# Altium footprint library ICs And Semiconductors THD.PcbLib: 507 footprints (part 29 of 32)
Each footprint in its own frame and in the unit in brackets; x right, y up, seen from the top. Pads: shape width x height; smd on the part's side, far side on the other; paste and mask are expansions set on the pad; w line width, h text height; cw(c..) or ccw(c..) is an arc to the next point about the centre after c.
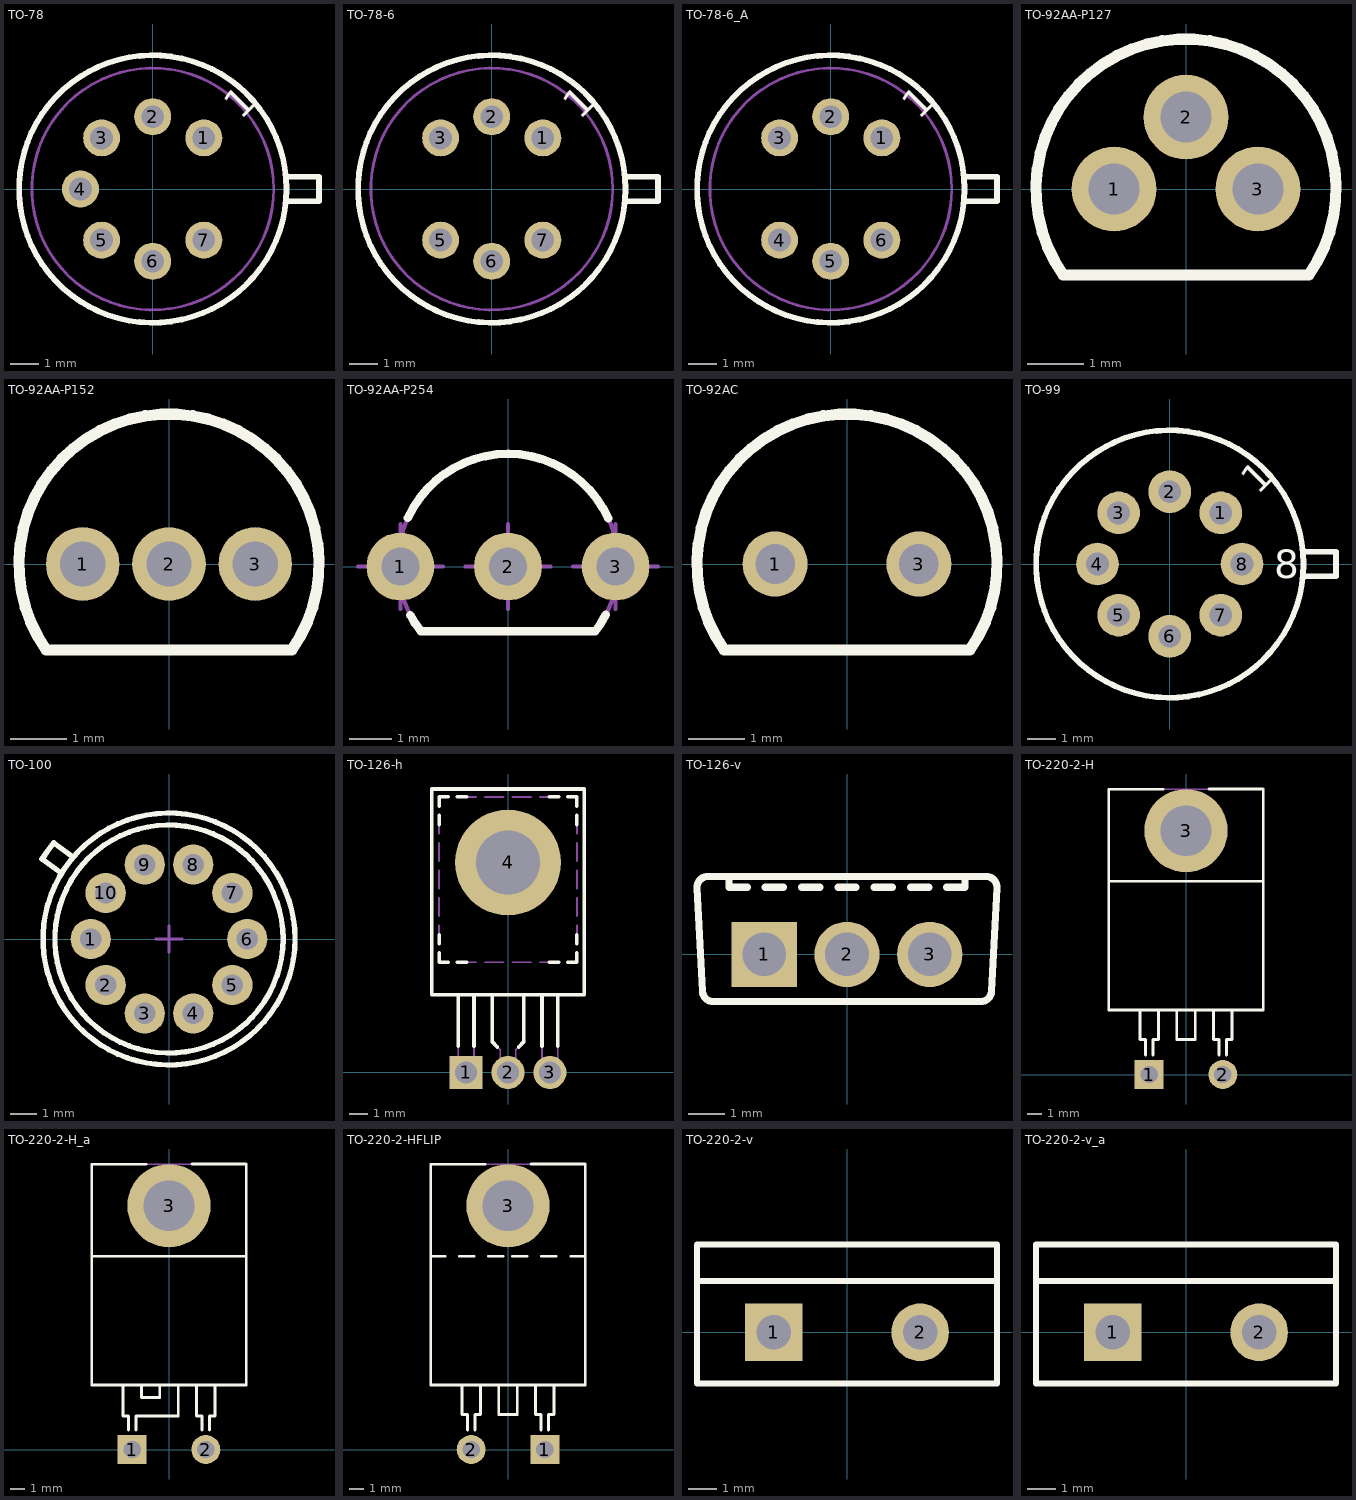
[diagram p28: the footprints below, top view; thin cyan lines are the x and y axes]

## TO-78 [mm] "TO-78 7 Leads, Body Dia. 9.4mm (max), Lead Diameter 5.08mm"
height 4.7
pads (7):
  round 1.3 hole 0.8: 1(1.796,1.796) 2(0,2.54) 3(-1.796,1.796) 4(-2.54,0) 5(-1.796,-1.796) 6(0,-2.54) 7(1.796,-1.796)
Top Overlay:
  circle w0.2: c0,0 r4.699
  lines w0.2: 4.679,-0.432 5.842,-0.432 5.842,0.432 4.679,0.432
  text "1" at 3.098,2.391 h1
Notvisible:
  text "7" at 2.239,-2.946 h1
  text "6" at -0.5,-3.69 h1
  text "5" at -2.946,-2.239 h1
  text "4" at -3.643,0.5 h1
  text "3" at -2.239,2.946 h1
  text "2" at 0.5,3.667 h1
Mechanical 14:
  circle w0.1: c0,0 r4.699
  circle w0.1: c0,0 r4.25
  lines w0.1: 4.679,-0.432 5.842,-0.432 5.842,0.432 4.679,0.432
  text "1" at 3.098,2.391 h1
3D body "TO-78.stp": height 4.7, standoff -3.6, extent -4.695,-4.695 5.835,4.695

## TO-78-6 [mm] "TO-78 6 Leads(1, 2, 3, 5, 6, 7) , Body Dia. 9.4mm (max), Lead Diameter 5.08mm"
height 4.7
pads (6):
  round 1.3 hole 0.8: 1(1.796,1.796) 2(0,2.54) 3(-1.796,1.796) 5(-1.796,-1.796) 6(0,-2.54) 7(1.796,-1.796)
Top Overlay:
  circle w0.2: c0,0 r4.699
  lines w0.2: 4.679,-0.432 5.842,-0.432 5.842,0.432 4.679,0.432
  text "1" at 3.098,2.391 h1
Notvisible:
  text "7" at 2.239,-2.946 h1
  text "6" at -0.5,-3.69 h1
  text "5" at -2.946,-2.239 h1
  text "4" at -3.643,0.5 h1
  text "3" at -2.239,2.946 h1
  text "2" at 0.5,3.667 h1
Mechanical 14:
  circle w0.1: c0,0 r4.699
  circle w0.1: c0,0 r4.25
  lines w0.1: 4.679,-0.432 5.842,-0.432 5.842,0.432 4.679,0.432
  text "1" at 3.098,2.391 h1
3D body "TO-78-6.stp": height 4.7, standoff -3.6, extent -4.695,-4.695 5.835,4.695

## TO-78-6_A [mm] "TO-78 6 Leads, Body Dia. 9.4mm (max), Lead Diameter 5.08mm"
height 4.7
pads (6):
  round 1.3 hole 0.8: 1(1.796,1.796) 2(0,2.54) 3(-1.796,1.796) 4(-1.796,-1.796) 5(0,-2.54) 6(1.796,-1.796)
Top Overlay:
  circle w0.2: c0,0 r4.699
  lines w0.2: 4.679,-0.432 5.842,-0.432 5.842,0.432 4.679,0.432
  text "1" at 3.098,2.391 h1
Notvisible:
  text "6" at 2.239,-2.946 h1
  text "5" at -0.5,-3.69 h1
  text "4" at -2.946,-2.239 h1
  text "3" at -2.239,2.946 h1
  text "2" at 0.5,3.667 h1
Mechanical 14:
  circle w0.1: c0,0 r4.699
  circle w0.1: c0,0 r4.25
  lines w0.1: 4.679,-0.432 5.842,-0.432 5.842,0.432 4.679,0.432
  text "1" at 3.098,2.391 h1
3D body "TO-78-6.stp": height 4.7, standoff -3.6, extent -4.695,-4.695 5.835,4.695

## TO-92AA-P127 [mm] "TO-92 (TO-226),  Pitch 1.27mm, Flat Index, 3 In-Line, Axial Leads, Body Dia. 5.3mm, Leads Dia. 0.5mm (max)"
height 5.33
pads (3):
  round 1.5 hole 0.9: 1(-1.27,0) 2(0,1.27) 3(1.27,0)
Top Overlay:
  lines w0.2: -2.171,-1.52 cw(c0,0) 2.171,-1.52 -2.171,-1.52
Mechanical 14:
  lines w0.1: -2.171,-1.52 cw(c0,0) 2.171,-1.52 -2.171,-1.52
3D body "TO-92AA-P127.stp": height 9.33, standoff -3.2, extent -2.579,-1.53 2.579,2.638

## TO-92AA-P152 [mm] "TO-92 (TO-226),  Pitch 1.524mm, Flat Index, 3 In-Line, Axial Leads, Body Dia. 5.3mm, Leads Dia. 0.5mm (max)"
height 5.33
pads (3):
  round 1.3 hole 0.8: 1(-1.524,0) 2(0,0) 3(1.524,0)
Top Overlay:
  lines w0.2: -2.171,-1.52 cw(c0,0) 2.171,-1.52 -2.171,-1.52
Mechanical 14:
  lines w0.1: -2.171,-1.52 cw(c0,0) 2.171,-1.52 -2.171,-1.52
3D body "TO-92AA-P152.stp": height 9.33, standoff -3.2, extent -2.587,-1.53 2.588,2.66

## TO-92AA-P254 [mm] "TO-92 (TO226), Pitch 2.54mm, Flat Index, 3 In-Line, Bent Leads, Body Dia. 5.3mm"
height 9.33
pads (3):
  round 1.6 hole 0.9: 1(-2.54,0) 2(0,0) 3(2.54,0)
Top Overlay:
  lines w0.2: -2.363,1.145 cw(c0,0.059) 2.369,1.133 ; -2.302,-1.151 ccw(c0,0.059) -2.059,-1.53 2.059,-1.53 ccw(c0,0.059) 2.307,-1.141
Notvisible:
  lines w0.1: -3.54,0 -2.54,0 ; -2.54,-1 -2.54,0 ; -2.54,1 -2.54,0 ; -1.54,0 -2.54,0 ; -1,0 0,0 ; 0,-1 0,0 ; 0,1 0,0 ; 1,0 0,0 ; 1.54,0 2.54,0 ; 2.54,-1 2.54,0 ; 2.54,1 2.54,0 ; 3.54,0 2.54,0
Mechanical 14:
  lines w0.1: -2.059,-1.53 cw(c0,0.059) 2.059,-1.53 -2.059,-1.53
3D body "TO-92AA-P254.stp": height 9.33, standoff -3.2, extent -2.81,-1.53 2.81,2.638

## TO-92AC [mm] "TO-92 (TO-226), Flat Index, 2 In-Line, Pitch 2.54mm, Axial Leads, Body Dia. 5.3mm, Leads Dia. 0.5mm (max)"
height 5.33
pads (2):
  round 1.15 hole 0.7: 1(-1.27,0) 3(1.27,0)
Top Overlay:
  lines w0.2: -2.171,-1.52 cw(c0,0) 2.171,-1.52 -2.171,-1.52
Mechanical 14:
  lines w0.1: -2.171,-1.52 cw(c0,0) 2.171,-1.52 -2.171,-1.52
3D body "TO-92AC.stp": height 9.33, standoff -3.2, extent -2.659,-1.523 2.516,2.667

## TO-99 [mm] "TO-99, 8 Leads, Body Dia. 9.4mm (max)"
height 5.72
pads (8):
  round 1.5 hole 0.8: 1(1.796,1.796) 2(0,2.54) 3(-1.796,1.796) 4(-2.54,0) 5(-1.796,-1.796) 6(0,-2.54) 7(1.796,-1.796) 8(2.54,0)
Top Overlay:
  circle w0.2: c0,0 r4.699
  lines w0.2: 4.679,-0.432 5.842,-0.432 5.842,0.432 4.679,0.432
  text "1" at 3.098,2.391 h1
  text "8" at 3.667,-0.5 h1
Notvisible:
  text "7" at 2.239,-2.946 h1
  text "6" at -0.5,-3.69 h1
  text "5" at -2.946,-2.239 h1
  text "4" at -3.643,0.5 h1
  text "3" at -2.239,2.946 h1
  text "2" at 0.5,3.667 h1
Mechanical 14:
  circle w0.1: c0,0 r4.699
  lines w0.1: 4.679,-0.432 5.842,-0.432 5.842,0.432 4.679,0.432
3D body "TO-99.stp": height 5.72, standoff -3.78, extent -4.7,-4.7 5.842,4.7

## TO-100 [mm] "TO-100, 10 Leads, Body Dia. 9.4mm (max)"
height 6.99
pads (10):
  round 1.5 hole 0.8: 1(-2.92,0) 2(-2.362,-1.716) 3(-0.902,-2.777) 4(0.902,-2.777) 5(2.362,-1.716) 6(2.92,0) 7(2.362,1.716) 8(0.902,2.777) 9(-0.902,2.777) 10(-2.362,1.716)
Top Overlay:
  circle w0.2: c0,0 r4.255
  circle w0.2: c0,0 r4.7
  lines w0.2: -4.747,2.985 -4.011,2.45 ; -4.737,2.978 cw(c0,0) -4.296,3.585 ; -4.306,3.592 -3.57,3.057
Notvisible:
  lines w0.1: -3.42,0 -2.92,0 ; -2.92,-0.5 -2.92,0 ; -2.92,0.5 -2.92,0 ; -2.767,-2.01 -2.362,-1.716 ; -2.767,2.01 -2.362,1.716 ; -2.656,-1.312 -2.362,-1.716 ; -2.656,1.312 -2.362,1.716 ; -2.42,0 -2.92,0 ; -2.068,-2.121 -2.362,-1.716 ; -2.068,2.121 -2.362,1.716 ; -1.958,-1.422 -2.362,-1.716 ; -1.958,1.422 -2.362,1.716 ; -1.378,-2.623 -0.902,-2.777 ; -1.378,2.623 -0.902,2.777 ; -1.057,-3.253 -0.902,-2.777 ; -1.057,3.253 -0.902,2.777 ; -0.748,-2.302 -0.902,-2.777 ; -0.748,2.302 -0.902,2.777 ; -0.5,0 0,0 ; -0.427,-2.932 -0.902,-2.777 ; -0.427,2.932 -0.902,2.777 ; 0,-0.5 0,0 ; 0,0.5 0,0 ; 0.427,-2.932 0.902,-2.777 ; 0.427,2.932 0.902,2.777 ; 0.5,0 0,0 ; 0.748,-2.302 0.902,-2.777 ; 0.748,2.302 0.902,2.777 ; 1.057,-3.253 0.902,-2.777 ; 1.057,3.253 0.902,2.777 ; 1.378,-2.623 0.902,-2.777 ; 1.378,2.623 0.902,2.777 ; 1.958,-1.422 2.362,-1.716 ; 1.958,1.422 2.362,1.716 ; 2.068,-2.121 2.362,-1.716 ; 2.068,2.121 2.362,1.716 ; 2.42,0 2.92,0 ; 2.656,-1.312 2.362,-1.716 ; 2.656,1.312 2.362,1.716 ; 2.767,-2.01 2.362,-1.716 ; 2.767,2.01 2.362,1.716 ; 2.92,-0.5 2.92,0 ; 2.92,0.5 2.92,0 ; 3.42,0 2.92,0
Mechanical 14:
  circle w0.1: c0,0 r4.255
  circle w0.1: c0,0 r4.7
  lines w0.1: -4.747,2.985 -4.011,2.45 cw(c0,0) -3.57,3.057 -4.306,3.592 ; -4.737,2.978 cw(c0,0) -4.296,3.585
3D body "TO-100.stp": height 5.97, standoff -3.6, extent -4.737,-4.7 4.7,4.7

## TO-126-h [mm] "TO-126 3-Terminal - Horizontal Mount"
height 3.45
pads (4):
  rect 1.8x1.8 hole 1.2: 1(-2.28,0)
  round 1.8 hole 1.2: 2(0,0) 3(2.28,0)
  round 5.75 hole 3.5: 4(0,11.43)
Top Overlay:
  lines w0.2: -3.75,6.5 -3.75,6 -3.25,6 ; -3.75,7 -3.75,7.5 ; -3.75,13.5 -3.75,14 ; -3.75,14.5 -3.75,15 -3.25,15 ; -2.75,6 -2.25,6 ; -2.75,15 -2.25,15 ; -2.705,1.439 -2.705,4.23 ; -1.855,1.439 -1.855,4.23 ; -0.85,4.23 -0.85,1.655 -0.579,1.384 ; 0.579,1.384 0.85,1.655 0.85,4.23 ; 1.855,1.439 1.855,4.23 ; 2.25,6 2.75,6 ; 2.25,15 2.75,15 ; 2.705,1.439 2.705,4.23 ; 3.25,6 3.75,6 3.75,6.5 ; 3.25,15 3.75,15 3.75,14.5 ; 3.75,7 3.75,7.5 ; 3.75,13.5 3.75,14 ; -4.15,4.23 4.15,4.23 4.15,15.43 -4.15,15.43 -4.15,4.23
Mechanical 14:
  circle w0.1: c0,11.43 r1.75
  lines w0.1: -3.75,6.5 -3.75,6 -3.25,6 ; -3.75,7 -3.75,8 ; -3.75,8.5 -3.75,9.5 ; -3.75,10 -3.75,11 ; -3.75,11.5 -3.75,12.5 ; -3.75,13 -3.75,14 ; -3.75,14.5 -3.75,15 -3.25,15 ; -2.75,6 -1.75,6 ; -2.75,15 -1.75,15 ; -2.705,4.23 -2.705,0 -1.855,0 -1.855,4.23 ; -1.25,6 -0.25,6 ; -1.25,15 -0.25,15 ; -0.85,4.23 -0.85,1.655 -0.425,1.23 -0.425,0 0.425,0 0.425,1.23 0.85,1.655 0.85,4.23 ; 0.25,6 1.25,6 ; 0.25,15 1.25,15 ; 1.75,6 2.75,6 ; 1.75,15 2.75,15 ; 1.855,4.23 1.855,0 2.705,0 2.705,4.23 ; 3.25,6 3.75,6 3.75,6.5 ; 3.25,15 3.75,15 3.75,14.5 ; 3.75,7 3.75,8 ; 3.75,8.5 3.75,9.5 ; 3.75,10 3.75,11 ; 3.75,11.5 3.75,12.5 ; 3.75,13 3.75,14 ; -4.15,4.23 -4.15,15.43 4.15,15.43 4.15,4.23 -4.15,4.23
3D body "TO-126-H.stp": height 3.45, standoff -3.1, extent -4.134,-0.3 4.134,15.43

## TO-126-v [mm] "TO-126 3-Terminal - Vertical Mount"
height 14.2
pads (3):
  rect 1.8x1.8 hole 1.2: 1(-2.28,0)
  round 1.8 hole 1.2: 2(0,0) 3(2.28,0)
Top Overlay:
  lines w0.2: -3.25,2.15 -3.25,1.85 -2.75,1.85 ; -2.25,1.85 -1.75,1.85 ; -1.25,1.85 -0.75,1.85 ; -0.25,1.85 0.25,1.85 ; 0.75,1.85 1.25,1.85 ; 1.75,1.85 2.25,1.85 ; 2.75,1.85 3.25,1.85 3.25,2.15 ; -4.133,1.834 cw(c-3.834,1.85) -3.834,2.15 3.834,2.15 cw(c3.834,1.85) 4.133,1.834 3.984,-1.016 cw(c3.685,-1) 3.685,-1.3 -3.685,-1.3 cw(c-3.685,-1) -3.984,-1.016 -4.133,1.834
Mechanical 14:
  lines w0.1: -3.25,2.15 -3.25,1.85 -2.75,1.85 ; -2.25,1.85 -1.75,1.85 ; -1.25,1.85 -0.75,1.85 ; -0.25,1.85 0.25,1.85 ; 0.75,1.85 1.25,1.85 ; 1.75,1.85 2.25,1.85 ; 2.75,1.85 3.25,1.85 3.25,2.15 ; -4.133,1.834 cw(c-3.834,1.85) -3.834,2.15 3.834,2.15 cw(c3.834,1.85) 4.133,1.834 3.984,-1.016 cw(c3.685,-1) 3.685,-1.3 -3.685,-1.3 cw(c-3.685,-1) -3.984,-1.016 -4.133,1.834
3D body "TO-126-V.stp": height 14.2, standoff -3.1, extent -4.134,-1.3 4.134,2.15

## TO-220-2-H [mm] "TO-220 2-Terminal + Tab - Horizontal Mount"
height 4.7
pads (3):
  rect 2x2 hole 1.2: 1(-2.54,0)
  round 2 hole 1.2: 2(2.54,0)
  round 5.75 hole 3.5: 3(0,16.828)
Top Overlay:
  lines w0.2: -5.334,13.335 5.334,13.335 ; -3.175,4.445 -3.175,2.413 -2.794,2.413 -2.794,1.35 ; -2.286,1.35 -2.286,2.413 -1.905,2.413 -1.905,4.445 ; -1.6,19.685 -5.334,19.685 -5.334,4.445 5.334,4.445 5.334,19.685 5.319,19.7 1.6,19.7 ; -0.635,4.445 -0.635,2.413 0.635,2.413 0.635,4.445 ; 1.905,4.445 1.905,2.413 2.286,2.413 2.286,1.35 ; 2.794,1.35 2.794,2.413 3.175,2.413 3.175,4.445
Mechanical 14:
  circle w0.1: c0,16.828 r2
  lines w0.1: -5.334,13.335 5.334,13.335 ; -3.175,4.445 -3.175,2.413 -2.794,2.413 -2.794,1.27 ; -2.286,1.27 -2.286,2.413 -1.905,2.413 -1.905,4.445 ; -0.635,4.445 -0.635,2.413 0.635,2.413 0.635,4.445 ; 1.905,4.445 1.905,2.413 2.286,2.413 2.286,1.27 ; 2.794,1.27 2.794,2.413 3.175,2.413 3.175,4.445 ; -5.334,4.445 5.334,4.445 5.334,19.685 -5.334,19.685 -5.334,4.445
3D body "TO-220-2-H.stp": height 4.7, standoff -3.5, extent -5.27,-0.28 5.27,19.49

## TO-220-2-H_a [mm] "TO-220 2-Terminal + Tab - Horizontal Mount"
height 4.7
pads (3):
  rect 2x2 hole 1.2: 1(-2.54,0)
  round 2 hole 1.2: 2(2.54,0)
  round 5.75 hole 3.5: 3(0,16.828)
Top Overlay:
  lines w0.2: -5.334,13.335 5.334,13.335 ; -3.175,4.445 -3.175,2.315 -2.794,2.315 -2.794,1.35 ; -2.286,1.35 -2.286,2.315 0.635,2.315 0.635,4.445 ; -1.905,4.445 -1.905,3.585 -0.635,3.585 -0.635,4.445 ; -1.6,19.685 -5.334,19.685 -5.334,4.445 5.334,4.445 5.334,19.685 5.319,19.7 1.6,19.7 ; 1.905,4.445 1.905,2.315 2.286,2.315 2.286,1.35 ; 2.794,1.35 2.794,2.315 3.175,2.315 3.175,4.445
Mechanical 14:
  circle w0.1: c0,16.828 r2
  lines w0.1: -5.334,13.335 5.334,13.335 ; -3.175,4.445 -3.175,2.315 -2.794,2.315 -2.794,1.35 ; -2.286,1.35 -2.286,2.315 0.635,2.315 0.635,4.445 ; -1.905,4.445 -1.905,3.585 -0.635,3.585 -0.635,4.445 ; 1.905,4.445 1.905,2.315 2.286,2.315 2.286,1.35 ; 2.794,1.35 2.794,2.315 3.175,2.315 3.175,4.445 ; -5.334,4.445 -5.334,19.685 5.334,19.685 5.334,4.445 -5.334,4.445
3D body "TO-220-2-H_a.stp": height 4.7, standoff -3.5, extent -5.27,-0.28 5.27,19.49

## TO-220-2-HFLIP [mm] "TO-220 2-Terminal + Tab - Flipped Horizontal Mount"
height 4.7
pads (3):
  rect 2x2 hole 1.2: 1(2.54,0)
  round 2 hole 1.2: 2(-2.54,0)
  round 5.75 hole 3.5: 3(0,16.828)
Top Overlay:
  lines w0.2: -5.334,13.335 -4.334,13.335 ; -3.334,13.335 -2.334,13.335 ; -3.175,4.445 -3.175,2.413 -2.794,2.413 -2.794,1.35 ; -2.286,1.35 -2.286,2.413 -1.905,2.413 -1.905,4.445 ; -1.6,19.685 -5.334,19.685 -5.334,4.445 5.334,4.445 5.334,19.685 5.319,19.7 1.6,19.7 ; -1.334,13.335 -0.334,13.335 ; -0.635,4.445 -0.635,2.413 0.635,2.413 0.635,4.445 ; 0.3,13.335 1.3,13.335 ; 1.905,4.445 1.905,2.413 2.286,2.413 2.286,1.35 ; 2.3,13.335 3.3,13.335 ; 2.794,1.35 2.794,2.413 3.175,2.413 3.175,4.445 ; 4.334,13.335 5.334,13.335
Mechanical 14:
  circle w0.1: c0,16.828 r2
  lines w0.1: -5.334,13.335 -4.334,13.335 ; -3.334,13.335 -2.334,13.335 ; -3.175,4.445 -3.175,2.413 -2.794,2.413 -2.794,1.27 ; -2.286,1.27 -2.286,2.413 -1.905,2.413 -1.905,4.445 ; -1.334,13.335 -0.334,13.335 ; -0.635,4.445 -0.635,2.413 0.635,2.413 0.635,4.445 ; 0.3,13.335 1.3,13.335 ; 1.905,4.445 1.905,2.413 2.286,2.413 2.286,1.27 ; 2.3,13.335 3.3,13.335 ; 2.794,1.27 2.794,2.413 3.175,2.413 3.175,4.445 ; 4.334,13.335 5.334,13.335 ; -5.334,4.445 5.334,4.445 5.334,19.685 -5.334,19.685 -5.334,4.445
3D body "TO-220-2-HFLIP.stp": height 4.7, standoff -4.7, extent -5.27,-0.28 5.27,19.49

## TO-220-2-v [mm] "TO-220 2-Terminal - Vertical Mount"
height 22.86
pads (2):
  rect 2x2 hole 1.2: 1(-2.54,0)
  round 2 hole 1.2: 2(2.54,0)
Top Overlay:
  lines w0.2: -5.207,1.778 5.207,1.778 ; -5.207,-1.778 5.207,-1.778 5.207,3.048 -5.207,3.048 -5.207,-1.778
Mechanical 14:
  lines w0.1: -5.207,1.778 5.207,1.778 ; -5.207,-1.778 5.207,-1.778 5.207,3.048 -5.207,3.048 -5.207,-1.778
3D body "TO-220-2-V.stp": height 20.5, standoff -3.5, extent -5.27,-1.75 5.27,2.95

## TO-220-2-v_a [mm] "TO-220 2-Terminal - Vertical Mount"
height 22.86
pads (2):
  rect 2x2 hole 1.2: 1(-2.54,0)
  round 2 hole 1.2: 2(2.54,0)
Top Overlay:
  lines w0.2: -5.207,1.778 5.207,1.778 ; -5.207,-1.778 5.207,-1.778 5.207,3.048 -5.207,3.048 -5.207,-1.778
Mechanical 14:
  lines w0.1: -5.207,1.778 5.207,1.778 ; -5.207,-1.778 5.207,-1.778 5.207,3.048 -5.207,3.048 -5.207,-1.778
3D body "TO-220-2-V_a.stp": height 20.5, standoff -3.5, extent -5.27,-1.75 5.27,2.95